# Altium schematic symbol library Library.SchLib: 824 symbols (part 3 of 9) (continued)
## BTA12-600 (continued)

## BXR315A
designator BX?, comment BXR513A
Xtal For RF
footprint BXR315A (Xtal for RF)
pins: 1, 2, 3

## Bxxxx - 1W
designator ?  (value not drawn)
Isolated power 1W
footprint Bxxxx - 1W
pins: 1 VIN-, 2 VIN+, 3 VOUT-, 4 VOUT+
text: Bxxxx-1W

## Bxxxx - 2W
designator ?  (value not drawn)
Isolated power 2W
footprint Bxxxx - 2W
pins: 1 VIN+, 2 VIN-, 4 VOUT-, 6 VOUT+
text: Bxxxx-2W

## C458
designator Q?
NPN 600mW, ECB; Value: C1815
footprint TO92-123 (TO-92)
footprint SOT23-321
footprint TO92-123 - 1 (TO-92)
footprint TO92-123 - 2 (TO-92)
footprint TO92-123 - 3 (TO-92)
pins: 1 E, 2 C, 3 B

## CA3161
designator IC?
Decoder BCD to 7segAC; Value: CA3161
footprint DIP16
pins: 1 B, 2 C, 3 NC, 4 NC, 5 NC, 6 D, 7 A, 8 GND (power) hidden to GND, 9 e, 10 d, 11 c, 12 b, 13 a, 14 g, 15 f, 16 VCC (power) hidden to VCC

## CA3162
designator IC?
ADC to BCDx3; Value: CA3162
footprint DIP16
pins: 1 B, 2 A, 3 NSD, 4 MSD, 5 LSD, 6 HOLE, 7 GND (power), 8 ZA, 9 ZA, 10 -IN, 11 +IN, 12 CAP, 13 GAIN, 14 VCC (power), 15 C, 16 D

## Cap
designator C?, comment XXpF
Value: 33pF
footprint CN1.5
footprint CN1
footprint CN2.5 (Tu pin to pin 250mil)
footprint CN3 (Cap np W 0.3)
footprint CN-SMD-0603
footprint CN-SMD-0805
footprint CN-SMD-0402
footprint CN-SMD-1206
footprint CN-SMD-2520 (TOKO INDUCTOR DFE252012 SERIES)
footprint CN-SMD-3225 (Chip Capacitor, Body 3.2x2.5mm, IPC Medium Density)
footprint CN2-T
footprint CN2-G
footprint CN0.8
footprint CN1-TA
footprint CN2-B
footprint CN2-LT
footprint CN2-O
footprint CN2-R
footprint CN2.5-BR (Tu pin to pin 250mil)
footprint CN2.5-R (Tu pin to pin 250mil)
footprint CN2.5-RV (Tu pin to pin 250mil)
footprint CN3.5 (Cap np W 0.3)
footprint CN4
footprint CN7 (Cap np W 0.3)
footprint CN3-B (Cap np W 0.3)
footprint CN7-B (Cap np W 0.3)
footprint CN7-N (Cap np W 0.3)
footprint CN7-Y (Cap np W 0.3)
footprint CN15 (Cap np W 0.3)
pins: 1, 2

## Cap-ALU-DIP
designator C?
Capacitor (Semiconductor SIM Model); Value: 104; LatestRevisionDate: 17-Jul-2002; LatestRevisionNote: Re-released for DXP Platform.; PackageReference: C1206; Publisher: Altium Limited
footprint CA-ALU-2.54
footprint CA-ALU-5 (Polarized capacitors, Aluminum Electrolytic Capacitors, 2-Leads, Body 5x11x2x0.5)
footprint CA-ALU-5B (Polarized capacitors, Aluminum Electrolytic Capacitors, 2-Leads, Body 5x11x2x0.5)
footprint CA-ALU-5L (Polarized capacitors, Aluminum Electrolytic Capacitors, 2-Leads, Body 5x11x2x0.5)
footprint CA-ALU-5R
footprint CA-ALU-5W (Tu hoa < 22uF/16>50V)
footprint CA-ALU-6.3 (Polarized capacitors, Aluminum Electrolytic Capacitors, 2-Leads, Body 6.3x15x2.5x0.5)
footprint CA-ALU-8 (Polarized capacitors, Aluminum Electrolytic Capacitors, 2-Leads, Body 8x16x3.5x0.5)
footprint CA-ALU-8R (Polarized capacitors, Aluminum Electrolytic Capacitors, 2-Leads, Body 8x16x3.5x0.5)
footprint CA-ALU-10 (Polarized capacitors, Aluminum Electrolytic Capacitors, 2-Leads, Body 10x20x5x0.6)
footprint CA-ALU-10R (Polarized capacitors, Aluminum Electrolytic Capacitors, 2-Leads, Body 10x20x5x0.6)
footprint CA-ALU-10RL (Polarized capacitors, Aluminum Electrolytic Capacitors, 2-Leads, Body 10x20x5x0.6)
footprint CA-ALU-13BL (Polarized capacitors, Aluminum Electrolytic Capacitors, 2-Leads, Body 13x35x5x0.6)
footprint CA-ALU-13R (Polarized capacitors, Aluminum Electrolytic Capacitors, 2-Leads, Body 13x35x5x0.6)
footprint CA-ALU-16 (Polarized capacitors, Aluminum Electrolytic Capacitors, 2-Leads, Body 16x21x7.5x0.8)
footprint CA-ALU-16H (Polarized capacitors, Aluminum Electrolytic Capacitors, 2-Leads, Body 16x31.5x7.5x0.8)
footprint CA-ALU-18 (Polarized capacitors, Aluminum Electrolytic Capacitors, 2-Leads, Body 18x35.5x7.5x0.8)
footprint CA-ALU-18BL (Polarized capacitors, Aluminum Electrolytic Capacitors, 2-Leads, Body 18x35.5x7.5x0.8)
footprint CA-ALU-18RH (Polarized capacitors, Aluminum Electrolytic Capacitors, 2-Leads, Body 18x35.5x7.5x0.8)
footprint CA-ALU-25 (Polarized capacitors, Aluminum Electrolytic Capacitors, 2-Leads, Body 22x41x10x0.8)
footprint CA-ALU-28 (Polarized capacitors, Aluminum Electrolytic Capacitors, 2-Leads, Body 22x41x10x0.8)
footprint CA-ALU-30 (Polarized capacitors, Aluminum Electrolytic Capacitors, 2-Leads, Body 22x41x10x0.8)
footprint CA-ALU-35L (Polarized capacitors, Aluminum Electrolytic Capacitors, 2-Leads, Body 22x41x10x0.8)
footprint CA-ALU-4 (Polarized capacitors, Aluminum Electrolytic Capacitors, 2-Leads, Body 5x11x2x0.5)
footprint CA-ALU-6.3R (Polarized capacitors, Aluminum Electrolytic Capacitors, 2-Leads, Body 6.3x15x2.5x0.5)
footprint CA-ALU-10BL (Polarized capacitors, Aluminum Electrolytic Capacitors, 2-Leads, Body 10x20x5x0.6)
footprint CA-ALU-10GR (Polarized capacitors, Aluminum Electrolytic Capacitors, 2-Leads, Body 10x20x5x0.6)
footprint CA-ALU-18R (Polarized capacitors, Aluminum Electrolytic Capacitors, 2-Leads, Body 18x35.5x7.5x0.8)
footprint CA-ALU-28R (Polarized capacitors, Aluminum Electrolytic Capacitors, 2-Leads, Body 22x41x10x0.8)
footprint CA-ALU-10 NGANG (Polarized capacitors, Aluminum Electrolytic Capacitors, 2-Leads, Body 10x20x5x0.6)
pins: 1, 2

## Cap-SEMI-DIP
designator C?
Capacitor (Semiconductor SIM Model); Value: 104; LatestRevisionDate: 17-Jul-2002; LatestRevisionNote: Re-released for DXP Platform.; PackageReference: C1206; Publisher: Altium Limited
footprint C-SE-7,5x10x9x5x4 (Film Capacitors, 2-Leads, Body 7,5x10x9x5)
footprint C-SE-7,5x11x13x9x4 (Film Capacitors, 2-Leads, Body 7,5x11x13x9)
footprint C-SE-10x12,5x20x10x4 (Film Capacitors, 2-Leads, Body 10x12,5x20x10)
footprint C-SE-10x13x12x6x4 (Film Capacitors, 2-Leads, Body 10x13x12x6)
footprint C-SE-12,5x15x16x10x4 (Film Capacitors, 2-Leads, Body 12,5x15x16x10)
footprint C-SE-15x18x13,5x6,5x4 (Film Capacitors, 2-Leads, Body 15x18x13,5x6,5)
footprint C-SE-15x18x17,5x10x4 (Film Capacitors, 2-Leads, Body 15x18x17,5x10)
footprint C-SE-22,5x26x20x11x4 (Film Capacitors, 2-Leads, Body 22,5x26x20x11)
footprint C-SE-27,5x31x29x15,5x4 (Film Capacitors, 2-Leads, Body 27,5x31x29x15,5)
footprint C-SE-37,5x41,5x35,5x22,5x4 (Film Capacitors, 2-Leads, Body 37,5x41,5x35,5x22,5)
pins: 1, 2

## Cap-SMD
designator C?
Polarized Capacitor (Axial); Published: 8-Jun-2000; LatestRevisionDate: 17-Jul-2002; LatestRevisionNote: Re-released for DXP Platform.; PackageReference: POLAR0.8; Publisher: Altium Limited
footprint CAP-ALU-SMD-4.5x5x1.4
footprint CAP-ALU-SMD-5x5.5x1.4
footprint CAP-ALU-SMD-5.5x5.5
footprint CAP-ALU-SMD-6.3x7.7x2.2
footprint CAP-ALU-SMD-C
footprint CAP-ALU-SMD-D
footprint CAP-ALU-SMD-F
footprint CAP-ALU-SMD-G
footprint CAP-ALU-SMD-H
footprint CAP-ALU-SMD-J
footprint CAP-ALU-SMD-K
footprint Tantalum 1206 (Tatalum capacitor 1206)
footprint Tantalum 1210 (Tatalum capacitor 1210)
footprint Tantalum 2312 (Tatalum capacitor 2312)
footprint Tantalum 2917 (Tatalum capacitor 2917)
pins: 1, 2
1 alternate drawing of the same symbol

## CC2530RHA40-4500X4500TP
designator U?, comment CC2530F256RHAT
CC2530 System-on-Chip Solution for 2.4-GHz IEEE 802.15.4 and ZigBee Applications; Manufacturer: Texas Instruments; Pin/Package: 40VQFN; Operating Voltage (Max) (V): 3.6; Sensitivity (Best) (dBm): -97; Wakeup Time (PD-->RX/TX) (us): 600; Operating Voltage (Min) (V): 2; Modulation Techniques: DSSS; Antenna Connection: Differential; Standby Current (uA): 0.4; TX Power (dBm): 4.5; RX Current (Lowest) (mA): 20.5; Flash size (KB): 256; Data Rate (Max) (kbps): 250; RAM Size (KB): 8; Frequency Range: 2.4GHz; ComponentLink2Description: Datasheet; PackageReference: S-PVQFN-N40; ComponentLink3URL: http://www.ti.com/lit/ml/mpqf135c/mpqf135c.pdf; ComponentLink1Description: Manufacturer URL; DatasheetVersion: SWRS081B; PartNumber: CC2530F256RHAT; Device Type: System-on-Chip; PackageDescription: 40-Pin Quad Flat No-Lead Package, Body 6 x 6mm, Pitch 0.5mm; ComponentLink1URL: http://www.ti.com/; ComponentLink2URL: http://www.ti.com/lit/ds/symlink/cc2530.pdf; Mounting Technology: Surface Mount; ComponentLink3Description: Package Specification; PackageVersion: 4204276/E
footprint QFN40 (QFN, 40-Leads, Body 6x6mm, Pitch 0.5mm, Thermal Pad 4.5x4.5mm)
pins: 1 GND (power) "Connect to GND", 2 GND (power) "Connect to GND", 3 GND (power) "Connect to GND", 4 GND (power) "Connect to GND", 5 P1_5 (io) "Port 1.5", 6 P1_4 (io) "Port 1.4", 7 P1_3 (io) "Port 1.3", 8 P1_2 (io) "Port 1.2", 9 P1_1 (io) "Port 1.1 ?20-mA drive capability", 10 DVDD2 (power) "2-V?.6-V digital power-supply connection", 11 P1_0 (io) "Port 1.0 ?20-mA drive capability", 12 P0_7 (io) "Port 0.7", 13 P0_6 (io) "Port 0.6", 14 P0_5 (io) "Port 0.5", 15 P0_4 (io) "Port 0.4", 16 P0_3 (io) "Port 0.3", 17 P0_2 (io) "Port 0.2", 18 P0_1 (io) "Port 0.1", 19 P0_0 (io) "Port 0.0", 20 RESET_N (in) "Reset, active-low", 21 AVDD5 (power) "2-V?.6-V analog power-supply connection", 22 XOSC_Q1 (in) "32-MHz crystal oscillator pin 1 or external-clock input", 23 XOSC_Q2 "32-MHz crystal oscillator pin 2", 24 AVDD3 (power) "2-V?.6-V analog power-supply connection", 25 RF_P (io) "Positive RF input signal to LNA during RX Positive RF output signal from PA during TX", 26 RF_N (io) "Negative RF input signal to LNA during RX Negative RF output signal from PA during TX", 27 AVDD2 (power) "2-V?.6-V analog power-supply connection", 28 AVDD1 (power) "2-V?.6-V analog power-supply connection", 29 AVDD4 (power) "2-V?.6-V analog power-supply connection", 30 RBIAS (in) "External precision bias resistor for reference current", 31 AVDD6 (power) "2-V?.6-V analog power-supply connection", 32 P2_4/XOSC32K_Q1 (io) "Port 2.4/32.768 kHz XOSC", 33 P2_3/XOSC32K_Q2 (io) "Port 2.3/32.768 kHz XOSC", 34 P2_2 (io) "Port 2.2", 35 P2_1 (io) "Port 2.1", 36 P2_0 (io) "Port 2.0", 37 P1_7 (io) "Port 1.7", 38 P1_6 (io) "Port 1.6", 39 DVDD1 (power) "2-V?.6-V digital power-supply connection", 40 DCOUPL (power) "1.8-V digital power-supply decoupling. Do not use for supplying external circuits.", 41 EP (power) "The ground pad must be connected to a solid ground plane."

## CDS1
designator PR?
Photoresistor; Creator: Bien Nguyen
footprint LED-5-WHITE (LED 2 PIN, 5 ly , Only colour, pin to pin 110mil)
pins: 1, 2

## CH4 Sensor
designator SS?
footprint CH4 Sensor
pins: 1 2V, 2 D+, 3 D+, 4 GND

## CH340C
designator U?
High and Low Side Driver; Note: Pins 4, 8 and 14 are not connected; Published: 8-Jun-2000; LatestRevisionDate: 04-Mar-2005; LatestRevisionNote: Stylized 3D Model Added.; DatasheetVersion: PD60147J; PackageReference: PDIP14; Publisher: Altium Limited; PackageDescription: DIP; 14 Leads; Row Spacing 7.62 mm; Pitch 2.54 mm; ComponentLink1Description: Manufacturer Link; ComponentLink1URL: http://www.irf.com/; ComponentLink2Description: Datasheet; ComponentLink2URL: http://www.irf.com/product-info/datasheets/data/ir2110.pdf
footprint SO16 (SOIC, 16-Leads, Body 9.90x3.91mm, Pitch 1.27mm, IPC Medium Density)
pins: 1 GND, 2 TXD, 3 RXD, 4 3V, 5 D+, 6 D-, 7 NC, 8 NC, 9 CTR#, 10 DSR#, 11 RI#, 12 DCD#, 13 DTR#, 14 RTS#, 15 RS232, 16 VCC

## CH340G
designator U?
High and Low Side Driver; Note: Pins 4, 8 and 14 are not connected; Published: 8-Jun-2000; LatestRevisionDate: 04-Mar-2005; LatestRevisionNote: Stylized 3D Model Added.; DatasheetVersion: PD60147J; PackageReference: PDIP14; Publisher: Altium Limited; PackageDescription: DIP; 14 Leads; Row Spacing 7.62 mm; Pitch 2.54 mm; ComponentLink1Description: Manufacturer Link; ComponentLink1URL: http://www.irf.com/; ComponentLink2Description: Datasheet; ComponentLink2URL: http://www.irf.com/product-info/datasheets/data/ir2110.pdf
footprint SO16 (SOIC, 16-Leads, Body 9.90x3.91mm, Pitch 1.27mm, IPC Medium Density)
pins: 1 GND, 2 TXD, 3 RXD, 4 3V, 5 D+, 6 D-, 7 XI, 8 XO, 9 CTR#, 10 DSR#, 11 RI#, 12 DCD#, 13 DTR#, 14 RTS#, 15 RS232, 16 VCC

## CO Sensor
designator SS?
footprint CO Sensor
pins: 1 C, 2 W, 3 R

## CON2
designator J?
footprint 53254-0270 (CONN HEADER R/A 2POS 2MM)
pins: 1, 2

## CON3
designator J?
footprint 53254-0370 (CONN HEADER R/A 3POS 2MM)
pins: 1, 2, 3

## CON4
designator J?
footprint 53254-0470 (CONN HEADER R/A 4POS 2MM)
footprint SM04B-SRSS-TBLFSN (CONN HEADER SMD R/A 4POS 1MM / PN: SM04B-SRSS-TB)
pins: 1, 2, 3, 4

## CON 9 Male
designator J?, comment DRB-09P11G1R
Connector, DB9 R/A Through-hole Male; Connector type: Header; Max Current: 3A; Mounting Technology: Through-Hole; Pin Count: 9; Status: Unreleased; Category: Connector
footprint DB9_MALE
pins: 1, 2, 3, 4, 5, 6, 7, 8, 9, 10 MH1, 11 MH2

## CON 9AC
designator C?, comment 210111003
D-SUB-Filter Connectors WE-DS, Solder Pin Straight; Manufacturer: Würth Elektronik eiSos GmbH; partNo: 210111003; ComponentLink1Description: Manufacturer; ComponentLink1URL: http://www.we-online.de; Created by: Christin Zierenner; Created Date: May 2012; ComponentLink2Description: Datasheet; ComponentLink2URL: http://katalog.we-online.de/kataloge/eisos/index.php?language=en&pf=Filter_gerade
footprint COM9A (D-SUB- 9P, MALE, RT ANGLE, TH)
footprint COM9C (D-SUB- 9P, MALE, SOLDER BUCKET VERTICAL MOUNT, TH)
footprint COM9SMDA (D-SUB- 9P, MALE, RT ANGLE, SMT)
footprint COM9F
pins: 1, 2, 3, 4, 5, 6, 7, 8, 9, 10 MH1, 11 MH2

## CON 9BD
designator D-Sub, comment 210611003
D-SUB-Filter Connectors WE-DS, Solder Pin Straight; Manufacturer: Würth Elektronik eiSos GmbH; partNo: 210611003; ComponentLink1Description: Manufacturer; ComponentLink1URL: http://www.we-online.de; Created by: Christin Zierenner; Created Date: May 2012; ComponentLink2Description: Datasheet; ComponentLink2URL: http://katalog.we-online.de/kataloge/eisos/index.php?language=en&pf=Filter_gerade
footprint COM9B (D-SUB- 9P, FEMALE, RT ANGLE, TH)
footprint COM9D (D-SUB- 9P, FEMALE, SOLDER BUCKET VERTICAL MOUNT, TH)
footprint COM9SMDB (D-SUB- 9P, FEMALE, RT ANGLE, SMT)
footprint COM9E (61800929321)
pins: 1, 2, 3, 4, 5, 6, 7, 8, 9, 10 MH1, 11 MH2

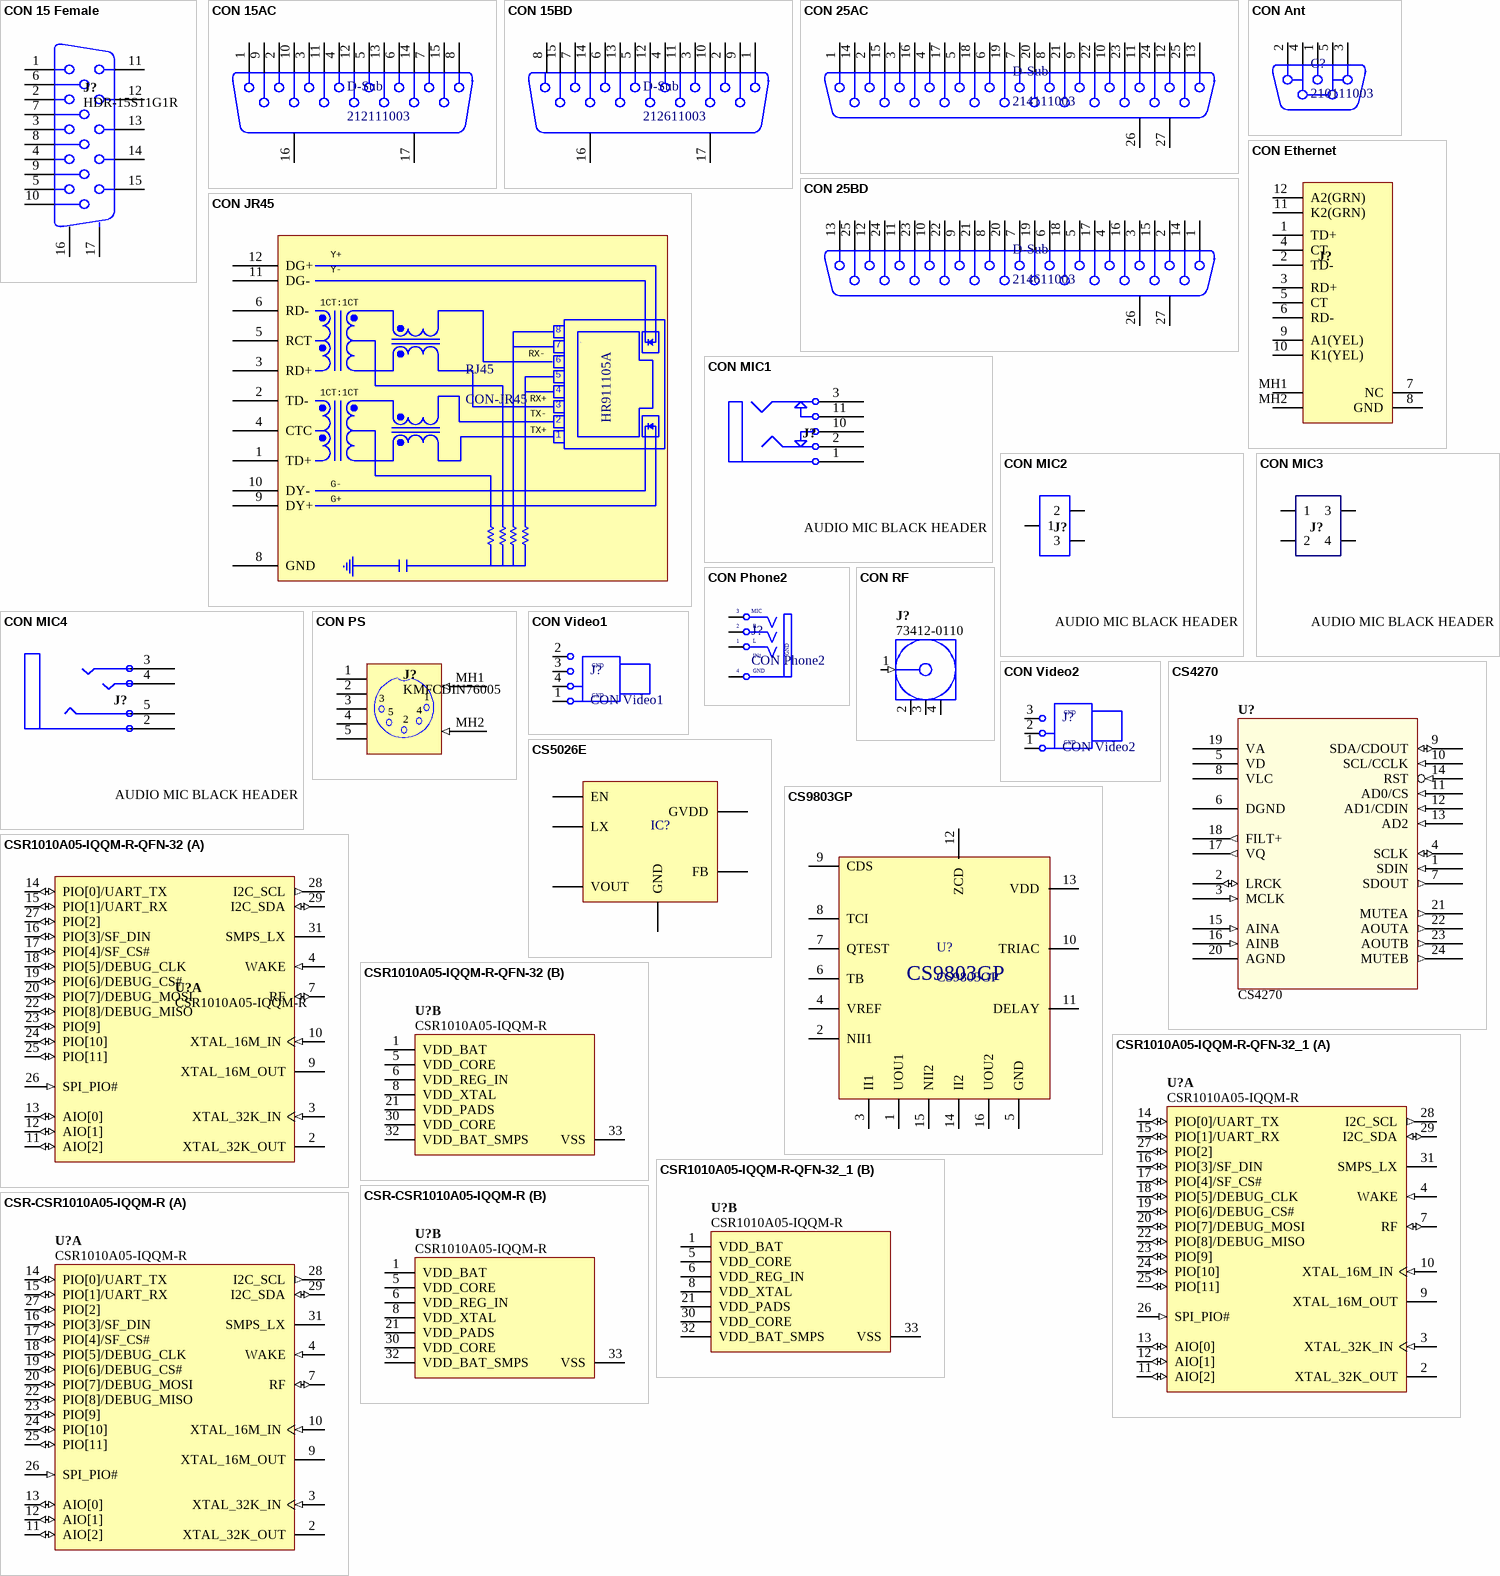
[diagram p19: symbols CON 15 Female to CSR-CSR1010A05-IQQM-R]

## CON 15 Female
designator J?, comment HDR-15S11G1R
Socket, High-Density DB15 (HD15) R/A Female Through-hole; Connector type: Right Angle; Max Current: 3 A; Category: Connector; Mounting Technology: Through-Hole; Pin Count: 15; Status: Unreleased
footprint DB15-VGA-Female
pins: 1 "Red Video", 2 "Green Video", 3 "Blue Video", 4 "Monitor ID Bit 2 (Ground)", 5 (power) "Ground", 6 (power) "Red Return (Ground)", 7 (power) "Green Return (Ground)", 8 (power) "Blue Return (Ground)", 9 "Key (not used)", 10 (power) "Sync Return (Ground)", 11 (power) "Monitor ID Bit 0 (Ground)", 12 "Monitor ID Bit 1 (Not Used)", 13 "Horizontal Zync", 14 "Vertical Sync", 15 "Vertical Sync", 16 MH1 "shield", 17 MH2 "shield"

## CON 15AC
designator D-Sub, comment 212111003
D-SUB-Filter Connectors WE-DS, Solder Pin Straight; Manufacturer: Würth Elektronik eiSos GmbH; partNo: 212111003; ComponentLink1Description: Manufacturer; ComponentLink1URL: http://www.we-online.de; Created by: Christin Zierenner; Created Date: May 2012; ComponentLink2Description: Datasheet; ComponentLink2URL: http://katalog.we-online.de/kataloge/eisos/index.php?language=en&pf=Filter_gerade
footprint COM15A (D-SUB- 15P, MALE, RT ANGLE, TH)
footprint COM15C (D-SUB- 15P, MALE, SOLDER BUCKET, TH)
footprint COM15SMDA (D-SUB- 15P, MALE, RT ANGLE, SMT)
pins: 1, 2, 3, 4, 5, 6, 7, 8, 9, 10, 11, 12, 13, 14, 15, 16 MH1, 17 MH2

## CON 15BD
designator D-Sub, comment 212611003
D-SUB-Filter Connectors WE-DS, Solder Pin Straight; Manufacturer: Würth Elektronik eiSos GmbH; partNo: 212611003; ComponentLink1Description: Manufacturer; ComponentLink1URL: http://www.we-online.de; Created by: Christin Zierenner; Created Date: May 2012; ComponentLink2Description: Datasheet; ComponentLink2URL: http://katalog.we-online.de/kataloge/eisos/index.php?language=en&pf=Filter_gerade
footprint COM15B (D-SUB- 15P, FEMALE, RT ANGLE, TH)
footprint COM15D (D-SUB- 15P, FEMALE, SOLDER BUCKET, TH)
footprint COM15SMDB (D-SUB- 15P, FEMALE, RT ANGLE, SMT)
pins: 1, 2, 3, 4, 5, 6, 7, 8, 9, 10, 11, 12, 13, 14, 15, 16 MH1, 17 MH2

## CON 25AC
designator D-Sub, comment 214111003
D-SUB-Filter Connectors WE-DS, Solder Pin Straight; Manufacturer: Würth Elektronik eiSos GmbH; partNo: 214111003; ComponentLink1Description: Manufacturer; ComponentLink1URL: http://www.we-online.de; Created by: Christin Zierenner; Created Date: May 2012; ComponentLink2Description: Datasheet; ComponentLink2URL: http://katalog.we-online.de/kataloge/eisos/index.php?language=en&pf=Filter_gerade
footprint COM25A (D-SUB- 25P, MALE, RT ANGLE, TH)
footprint COM25C (D-SUB- 25P, MALE, STRAIGHT, TH)
pins: 1, 2, 3, 4, 5, 6, 7, 8, 9, 10, 11, 12, 13, 14, 15, 16, 17, 18, 19, 20, 21, 22, 23, 24, 25, 26 MH1, 27 MH2

## CON 25BD
designator D-Sub, comment 214611003
D-SUB-Filter Connectors WE-DS, Solder Pin Straight; Manufacturer: Würth Elektronik eiSos GmbH; partNo: 214611003; ComponentLink1Description: Manufacturer; ComponentLink1URL: http://www.we-online.de; Created by: Christin Zierenner; Created Date: May 2012; ComponentLink2Description: Datasheet; ComponentLink2URL: http://katalog.we-online.de/kataloge/eisos/index.php?language=en&pf=Filter_gerade
footprint COM25B (D-SUB- 25P, FEMALE, RT ANGLE, TH)
footprint COM25D (D-SUB- 25P, FEMALE, SOLDER BUCKET, TH)
pins: 1, 2, 3, 4, 5, 6, 7, 8, 9, 10, 11, 12, 13, 14, 15, 16, 17, 18, 19, 20, 21, 22, 23, 24, 25, 26 MH1, 27 MH2

## CON Ant
designator C?, comment 210111003
CONNECTOR ANTEN; Manufacturer: Würth Elektronik eiSos GmbH; partNo: 210111003; ComponentLink1Description: Manufacturer; ComponentLink1URL: http://www.we-online.de; Created by: Christin Zierenner; Created Date: May 2012; ComponentLink2Description: Datasheet; ComponentLink2URL: http://katalog.we-online.de/kataloge/eisos/index.php?language=en&pf=Filter_gerade
footprint SMA-ENDLAUNCH
footprint SMA-RA
footprint SMA-V
footprint SMA_ENDLAUNCH
pins: 1, 2, 3, 4, 5

## CON Ethernet
designator J?
Socket, PC Jack 8-Way, R/A Low-profile; Connector type: Right Angle; Max Current: mA; Mounting Technology: Surface Mount; Status: Unreleased; Category: Connector
footprint Ethernet (Connector; PCB Jack, Thru-Hole; 1-Port, 8 Positions, 8 Loaded; Shielded without Lightpipes; Vertical)
pins: 1 TD+, 2 TD-, 3 RD+, 4 CT, 5 CT, 6 RD-, 7 NC, 8 GND, 9 A1(YEL), 10 K1(YEL), 11 K2(GRN), 12 A2(GRN), MH1, MH2

## CON JR45
designator RJ45, comment CON-JR45
footprint CON JR45
pins: 1 TD+, 2 TD-, 3 RD+, 4 CTC, 5 RCT, 6 RD-, 8 GND (power), 9 DY+, 10 DY-, 11 DG-, 12 DG+
text: Y+; Y-; 1CT:1CT; 7; RX-; RX+; TX-; HR911105A; TX+; G-; G+

## CON MIC1
designator J?, comment AUDIO MIC BLACK HEADER
Connector, 3.5mm Stereo Audio Socket, Black, 2 break contacts (normals) and 2 auxiliary make contacts; Connector type: AUDIO BLACK HEADER; Category: Connector; Status: Production
footprint CON MIC1
pins: 1, 2, 3, 10, 11

## CON MIC2
designator J?, comment AUDIO MIC BLACK HEADER
Connector, 3.5mm Stereo Audio Socket, Black, 2 break contacts (normals) and 2 auxiliary make contacts; Connector type: AUDIO BLACK HEADER; Category: Connector; Status: Production
footprint CON MIC2
pins: 1, 2, 3

## CON MIC3
designator J?, comment AUDIO MIC BLACK HEADER
Connector, 3.5mm Stereo Audio Socket, Black, 2 break contacts (normals) and 2 auxiliary make contacts; Connector type: AUDIO BLACK HEADER; Category: Connector; Status: Production
footprint CON MIC3
pins: 1, 2, 3, 4

## CON MIC4
designator J?, comment AUDIO MIC BLACK HEADER
PJ320A PJ320D; Connector type: AUDIO BLACK HEADER; Category: Connector; Status: Production
footprint PJ-320D (Jack Audio 3.5MM PJ-320D 4P)
pins: 2, 3, 4, 5

## CON Phone2
designator J?
Jac Phone Stereo; Creat by: VanDungEvn@Gmail.com
footprint 3.5mm
pins: 2 S1 "Tip Normal (Break Contact)", 3 TN "Tip Normal (Break Contact)", 4 S (power) "Sleeve (Ground)", 5 GND "Tip"
text: MIC; R; 1; L; IN1

## CON PS
designator J?, comment KMFCDIN76005
Socket, 5-way R/A DIN; Connector type: Right Angle; Max Current: mA; Mounting Technology: Through-Hole; Status: Unreleased; Category: Connector
footprint KMFCDIN76005
pins: 1, 2, 3, 4, 5, MH1 (in), MH2 (in)

## CON RF
designator J?, comment 73412-0110
Microcoaxial RF, 50 Ohm, PCB Vertical Jack Receptacle, SMT, 1.25mm Mounted Height; Sub-class: Serial Bus; IEC-class: Connector; Body Length: 4 mm; Datasheet: http://www.molex.com/webdocs/datasheets/pdf/en-us/0734120110_RF_COAX_CONNECTORS.pdf; Terminal Pitch: 3 mm; Class: Connector
footprint CON RF (Microcoaxial RF, 50 Ohm, PCB Vertical Jack Receptacle, SMT, 1.25mm Mounted Height)
pins: 1 Signal (in) "Signal Pin", 2 GND (power), 3 GND (power), 4 GND (power)

## CON Video1
designator J?
Jac Video Stereo
footprint TRC-005 (RCA Phono Jack, Right Angle, Thru-Hole, Body 20.8 x 9.8 x 11 mm (LxWxH))
pins: 1 Black, 2 Yellow, 3 White, 4 Red
text: GND

## CON Video2
designator J?
Jac Video Stereo
footprint TRC-006
pins: 1, 2, 3
text: GND

## CS4270
designator U?
CS4270; 24-Bit, 192 kHz Stereo Audio CODEC; AudioICTypes: Amplifier; Supply Voltage: mV; Mounting Technology: Surface Mount; Status: Unreleased; Category: IC-Audio
footprint TSSOP24 (TSSOP, 24-Leads, Body 7.80x4.40mm, Pitch 0.65mm, IPC High Density)
pins: 1 SDIN (in), 2 LRCK (io), 3 MCLK (in), 4 SCLK (io), 5 VD (power), 6 DGND (power), 7 SDOUT (out), 8 VLC (power), 9 SDA/CDOUT (io), 10 SCL/CCLK (in), 11 AD0/CS (in), 12 AD1/CDIN (in), 13 AD2 (in), 14 RST (in), 15 AINA (in), 16 AINB (in), 17 VQ (out), 18 FILT+ (out), 19 VA (power), 20 AGND (power), 21 MUTEA (out), 22 AOUTA (out), 23 AOUTB (out), 24 MUTEB (out)

## CS5026E
designator IC?  (value not drawn)
footprint HSO16 (SOIC, 16-Leads, Body 9.90x3.91mm, Pitch 1.27mm, IPC Medium Density)
pins: 4,8,12,17 GND, 5,6,7 LX, 9 VOUT, 10 GVDD, 13 FB, 14 EN

## CS9803GP
designator U?
Infrared Induction Control IC
footprint DIP16
pins: 1 UOU1, 2 NII1, 3 II1, 4 VREF, 5 GND (power), 6 TB (power), 7 QTEST (power), 8 TCI (power), 9 CDS (power), 10 TRIAC (power), 11 DELAY (power), 12 ZCD (power), 13 VDD (power), 14 II2 (power), 15 NII2 (power), 16 UOU2 (power)